# Altium footprint library PCB封装库.PcbLib: 77 footprints (part 3 of 5)
Each footprint in its own frame and in the unit in brackets; x right, y up, seen from the top. Pads: shape width x height; smd on the part's side, far side on the other; paste and mask are expansions set on the pad; w line width, h text height; cw(c..) or ccw(c..) is an arc to the next point about the centre after c.
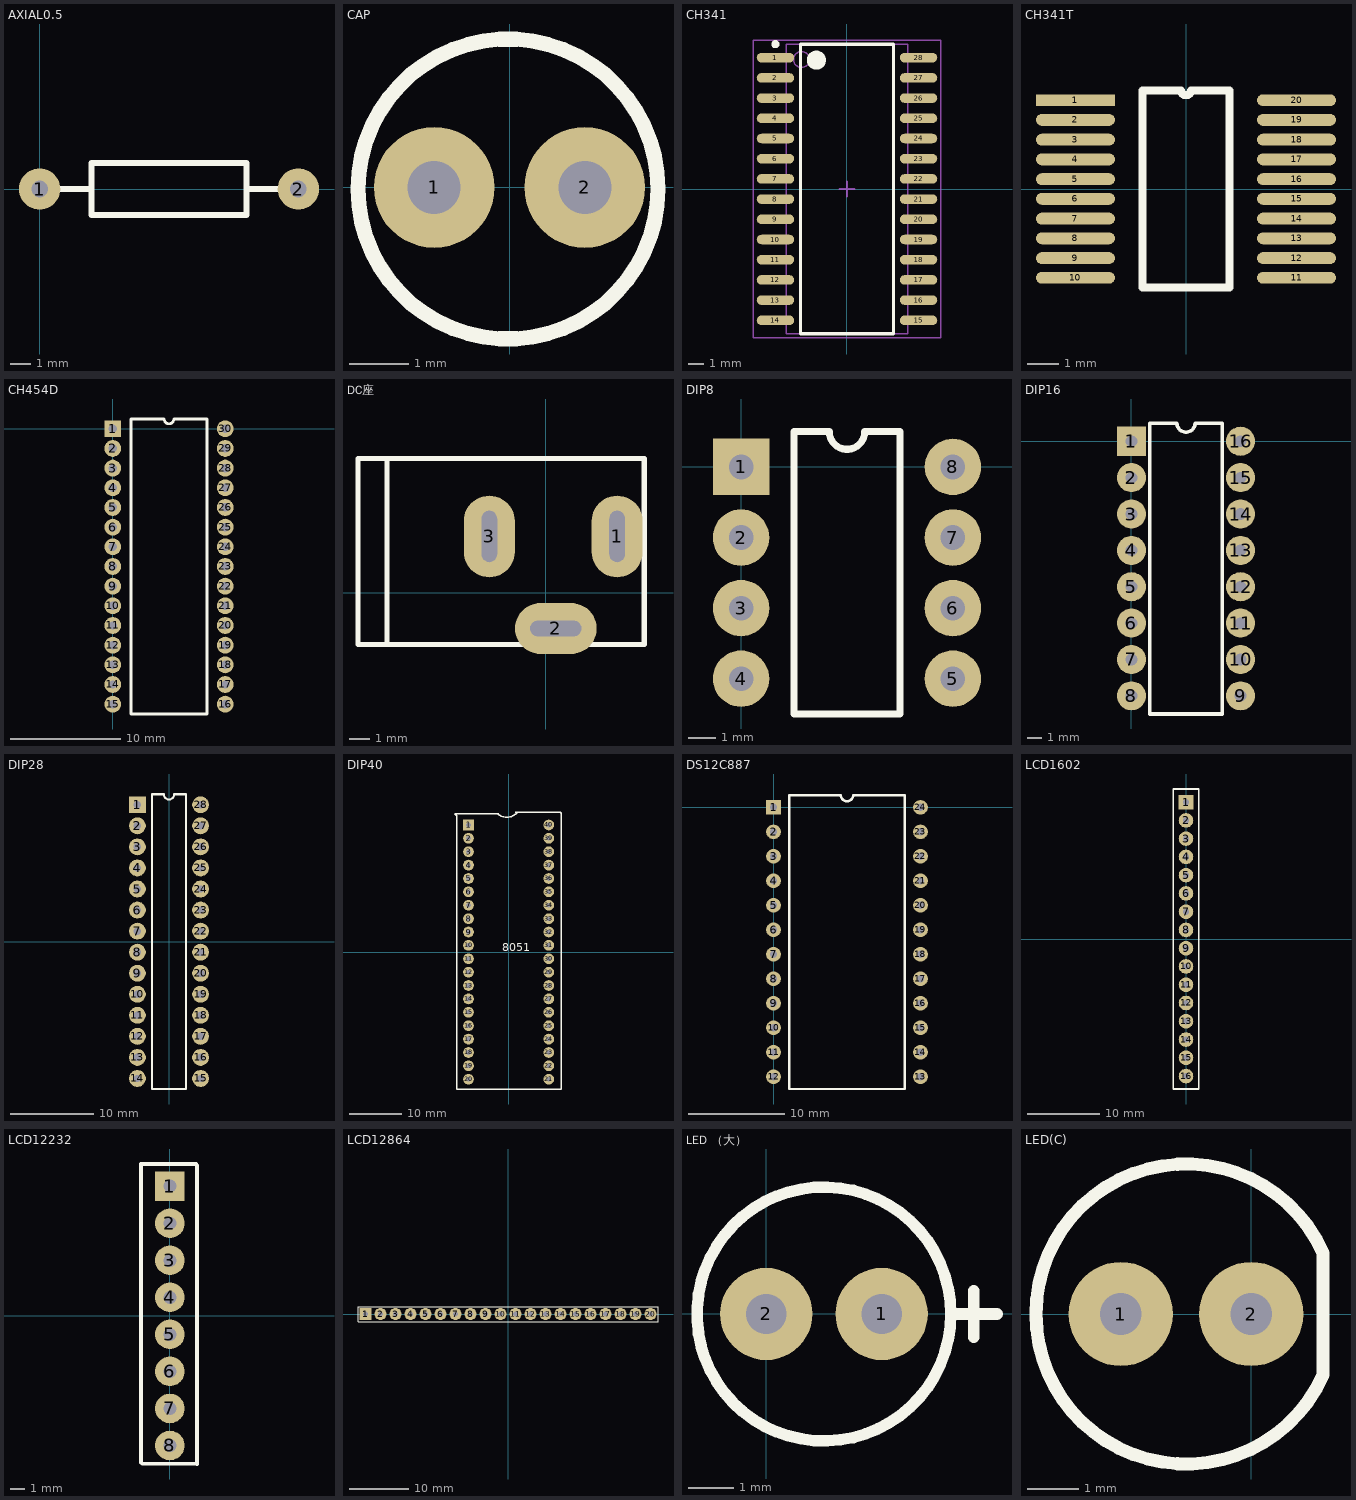
[diagram p2: the footprints below, top view; thin cyan lines are the x and y axes]

## AXIAL0.5 [mil]
pads (2):
  round 80 hole 32: 1(0,0) 2(500,0)
Top Overlay:
  lines w12: 40,0 100,0 ; 400,0 460,0 ; 100,-50 400,-50 400,50 100,50 100,-50

## CAP [mil]
pads (2):
  round 80 hole 35: 1(-50,0) 2(50,0)
Top Overlay:
  circle w10: c-1,-1 r99.46

## CH341 [mm]
pads (28):
  oval 2.35x0.6 smd: 1(-4.5,8.255) 2(-4.5,6.985) 3(-4.5,5.715) 4(-4.5,4.445) 5(-4.5,3.175) 6(-4.5,1.905) 7(-4.5,0.635) 8(-4.5,-0.635) 9(-4.5,-1.905) 10(-4.5,-3.175) 11(-4.5,-4.445) 12(-4.5,-5.715) 13(-4.5,-6.985) 14(-4.5,-8.255) 15(4.5,-8.255) 16(4.5,-6.985) 17(4.5,-5.715) 18(4.5,-4.445) 19(4.5,-3.175) 20(4.5,-1.905) 21(4.5,-0.635) 22(4.5,0.635) 23(4.5,1.905) 24(4.5,3.175) 25(4.5,4.445) 26(4.5,5.715) 27(4.5,6.985) 28(4.5,8.255)
Top Overlay:
  circle w0.6: c-1.925,8.1 r0.3
  circle w0.25: c-4.5,9.105 r0.125
  lines w0.2: -2.925,-9.1 2.925,-9.1 2.925,9.1 -2.925,9.1 -2.925,-9.1
Mechanical 13:
  circle w0.1: c-2.86,8.14 r0.5
  lines w0.1: -3.81,-9.09 3.81,-9.09 3.81,9.09 -3.81,9.09 -3.81,-9.09
Mechanical 15:
  lines w0.1: -0.5,0 0.5,0 ; 0,-0.5 0,0.5 ; -5.9,-9.35 5.9,-9.35 5.9,9.35 -5.9,9.35 -5.9,-9.35
3D body: height 2.33, standoff 0.25, extent -3.81,-9.09 3.81,9.09

## CH341T [mil]
pads (20):
  rect 100x15 smd: 1(-140,112.5)
  oval 100x15 smd: 2(-140,87.5) 3(-140,62.5) 4(-140,37.5) 5(-140,12.5) 6(-140,-12.5) 7(-140,-37.5) 8(-140,-62.5) 9(-140,-87.5) 10(-140,-112.5) 11(140,-112.5) 12(140,-87.5) 13(140,-62.5) 14(140,-37.5) 15(140,-12.5) 16(140,12.5) 17(140,37.5) 18(140,62.5) 19(140,87.5) 20(140,112.5)
Top Overlay:
  lines w10: -55,-125 -55,125 -6.25,125 ccw(c0,125) 6.25,125 55,125 55,-125 -55,-125

## CH454D [mil]
pads (30):
  rect 60x60 hole 30: 1(0,0)
  round 60 hole 30: 2(0,-70) 3(0,-140) 4(0,-210) 5(0,-280) 6(0,-350) 7(0,-420) 8(0,-490) 9(0,-560) 10(0,-630) 11(0,-700) 12(0,-770) 13(0,-840) 14(0,-910) 15(0,-980) 16(400,-980) 17(400,-910) 18(400,-840) 19(400,-770) 20(400,-700) 21(400,-630) 22(400,-560) 23(400,-490) 24(400,-420) 25(400,-350) 26(400,-280) 27(400,-210) 28(400,-140) 29(400,-70) 30(400,0)
Top Overlay:
  lines w10: 65,-1015 335,-1015 335,35 217.5,35 cw(c200,35) 182.5,35 65,35 65,-1015

## DC座 [mil]
pads (3):
  oval 100x160 hole 30 slot 100 at 90 deg unplated: 1(140,110)
  oval 160x100 hole 30 slot 100 at 0 deg: 2(20,-70)
  oval 100x160 hole 30 slot 100 at 90 deg: 3(-110,110)
Top Overlay:
  lines w10: -310,-101.25 -310,262.25 ; -367,-101.25 193,-101.25 193,262.25 -367,262.25 -367,-101.25

## DIP8 [mil]
pads (8):
  rect 80x80 hole 35: 1(0,0)
  round 80 hole 35: 2(0,-100) 3(0,-200) 4(0,-300) 5(300,-300) 6(300,-200) 7(300,-100) 8(300,0)
Top Overlay:
  lines w10: 75,-350 75,50 125,50 ccw(c150,50) 175,50 225,50 225,-350 75,-350

## DIP16 [mil]
pads (16):
  rect 80x80 hole 32: 1(0,0)
  round 80 hole 32: 2(0,-100) 3(0,-200) 4(0,-300) 5(0,-400) 6(0,-500) 7(0,-600) 8(0,-700) 9(300,-700) 10(300,-600) 11(300,-500) 12(300,-400) 13(300,-300) 14(300,-200) 15(300,-100) 16(300,0)
Top Overlay:
  lines w10: 50,-750 250,-750 250,50 175,50 cw(c150,50) 125,50 50,50 50,-750

## DIP28 [mil]
pads (28):
  rect 80x80 hole 35: 1(-150,650)
  round 80 hole 35: 2(-150,550) 3(-150,450) 4(-150,350) 5(-150,250) 6(-150,150) 7(-150,50) 8(-150,-50) 9(-150,-150) 10(-150,-250) 11(-150,-350) 12(-150,-450) 13(-150,-550) 14(-150,-650) 15(150,-650) 16(150,-550) 17(150,-450) 18(150,-350) 19(150,-250) 20(150,-150) 21(150,-50) 22(150,50) 23(150,150) 24(150,250) 25(150,350) 26(150,450) 27(150,550) 28(150,650)
Top Overlay:
  lines w10: -80,-700 -80,700 -25,700 ccw(c0,700) 25,700 80,700 80,-700 -80,-700

## DIP40 [mil]
pads (40):
  rect 80x80 hole 35: 1(-300,950)
  round 80 hole 35: 2(-300,850) 3(-300,750) 4(-300,650) 5(-300,550) 6(-300,450) 7(-300,350) 8(-300,250) 9(-300,150) 10(-300,50) 11(-300,-50) 12(-300,-150) 13(-300,-250) 14(-300,-350) 15(-300,-450) 16(-300,-550) 17(-300,-650) 18(-300,-750) 19(-300,-850) 20(-300,-950) 21(300,-950) 22(300,-850) 23(300,-750) 24(300,-650) 25(300,-550) 26(300,-450) 27(300,-350) 28(300,-250) 29(300,-150) 30(300,-50) 31(300,50) 32(300,150) 33(300,250) 34(300,350) 35(300,450) 36(300,550) 37(300,650) 38(300,750) 39(300,850) 40(300,950)
Top Overlay:
  lines w10: -84,1034 ccw(c-14,1113) 65,1043 ; -74,1034 -367,1034 -368,1033 -402,1033 -389,1020 -389,-1023 392,-1023 392,1036 385,1043 51,1043
  text "8051" at -49,6 h60

## DS12C887 [mil]
pads (24):
  rect 60x60 hole 30: 1(0,0)
  round 60 hole 30: 2(0,-100) 3(0,-200) 4(0,-300) 5(0,-400) 6(0,-500) 7(0,-600) 8(0,-700) 9(0,-800) 10(0,-900) 11(0,-1000) 12(0,-1100) 13(600,-1100) 14(600,-1000) 15(600,-900) 16(600,-800) 17(600,-700) 18(600,-600) 19(600,-500) 20(600,-400) 21(600,-300) 22(600,-200) 23(600,-100) 24(600,0)
Top Overlay:
  lines w10: 65,-1150 535,-1150 535,50 325,50 cw(c300,50) 275,50 65,50 65,-1150

## LCD1602 [mil]
pads (16):
  rect 80x80 hole 35: 1(0,750)
  round 80 hole 35: 2(0,650) 3(0,550) 4(0,450) 5(0,350) 6(0,250) 7(0,150) 8(0,50) 9(0,-50) 10(0,-150) 11(0,-250) 12(0,-350) 13(0,-450) 14(0,-550) 15(0,-650) 16(0,-750)
Top Overlay:
  lines w10: 69,-821 -70,-821 -70,822 70,822 70,-821

## LCD12232 [mil]
pads (8):
  rect 80x80 hole 35: 1(0,350)
  round 80 hole 35: 2(0,250) 3(0,150) 4(0,50) 5(0,-50) 6(0,-150) 7(0,-250) 8(0,-350)
Top Overlay:
  lines w10: -78,-396 -78,410 71,410 73,407 73,-400 67,-399 -75,-399 -78,-396

## LCD12864 [mil]
pads (20):
  rect 80x80 hole 35.43: 1(-950,0)
  round 80 hole 35.43: 2(-850,0) 3(-750,0) 4(-650,0) 5(-550,0) 6(-450,0) 7(-350,0) 8(-250,0) 9(-150,0) 10(-50,0) 11(50,0) 12(150,0) 13(250,0) 14(350,0) 15(450,0) 16(550,0) 17(650,0) 18(750,0) 19(850,0) 20(950,0)
Top Overlay:
  lines w7.87: -1000,-50 1000,-50 1000,50 -925,50 -1000,50 -1000,-50

## LED （大） [mil]
pads (2):
  round 80 hole 35: 1(100,0) 2(0,0)
Top Overlay:
  circle w10: c50,0 r110
  lines w10: 160,0 200,0 ; 180,-20 180,20

## LED(С) [mil]
pads (2):
  round 80 hole 32: 1(-100,0) 2(0,0)
Top Overlay:
  lines w10: 55.09,-46.71 cw(c-50,0) 55.09,46.71 55.09,-46.7